# Altium footprint library Sajad_Altium_Library.PcbLib: 333 footprints (part 1 of 21)
Each footprint in its own frame and in the unit in brackets; x right, y up, seen from the top. Pads: shape width x height; smd on the part's side, far side on the other; paste and mask are expansions set on the pad; w line width, h text height; cw(c..) or ccw(c..) is an arc to the next point about the centre after c.
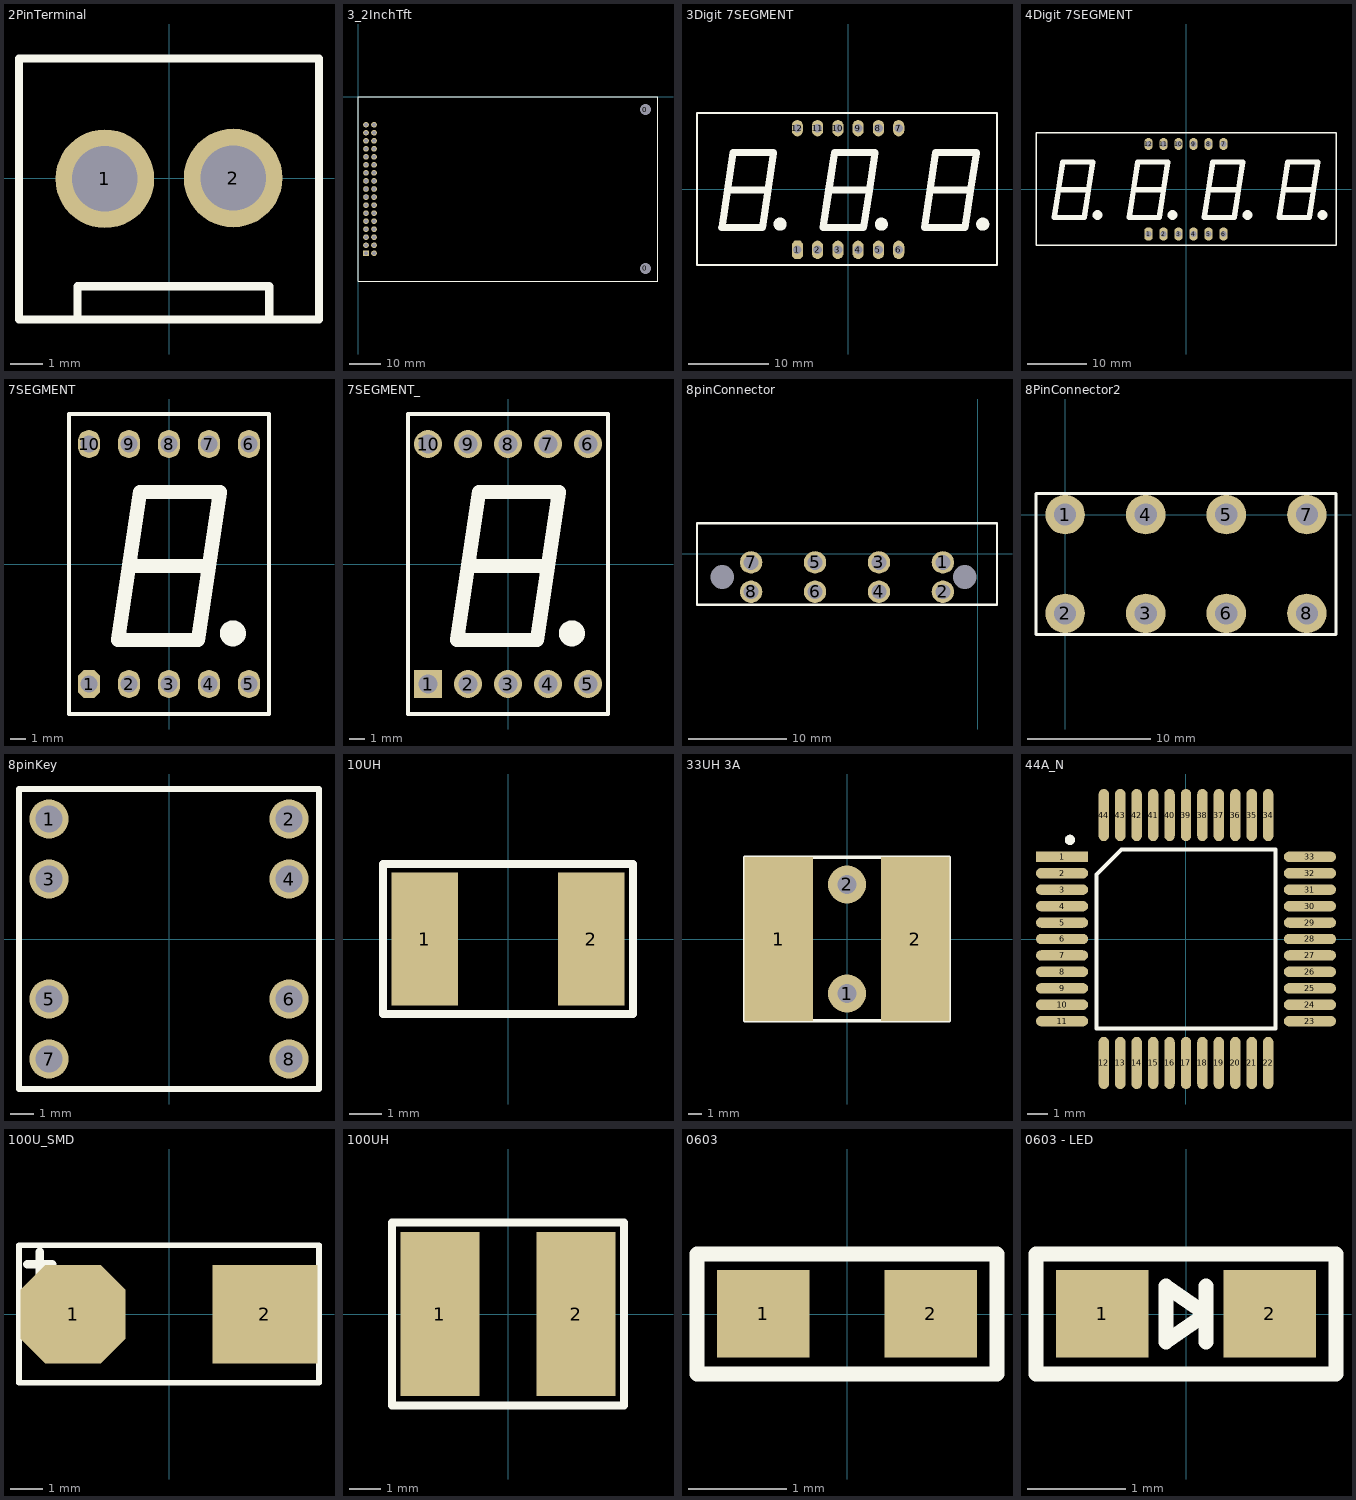
[diagram p0: the footprints below, top view; thin cyan lines are the x and y axes]

## 2PinTerminal [mm]
pads (2):
  round 3.02 hole 2: 1(-1.962,-0.013) 2(1.962,0.013)
Top Overlay:
  lines w0.254: -2.8,-4.318 -2.8,-3.302 3.067,-3.302 3.067,-4.318 ; -4.591,-4.318 4.591,-4.318 4.591,3.67 -4.591,3.67 -4.591,-4.318

## 3_2InchTft [mil]
height 372.05
pads (36):
  round 118.11 hole 137.8: 0(3577.13,-2133.86) 0(3577.13,-157.48)
  rect 70x70 hole 45: 1(99.61,-1945.67)
  round 70 hole 45: 2(199.61,-1945.67) 3(99.61,-1845.67) 4(199.61,-1845.67) 5(99.61,-1745.67) 6(199.61,-1745.67) 7(99.61,-1645.67) 8(199.61,-1645.67) 9(99.61,-1545.67) 10(199.61,-1545.67) 11(99.61,-1445.67) 12(199.61,-1445.67) 13(99.61,-1345.67) 14(199.61,-1345.67) 15(99.61,-1245.67) 16(199.61,-1245.67) 17(99.61,-1145.67) 18(199.61,-1145.67) 19(99.61,-1045.67) 20(199.61,-1045.67) 21(99.61,-945.67) 22(199.61,-945.67) 23(99.61,-845.67) 24(199.61,-845.67) 25(99.61,-745.67) 26(199.61,-745.67) 27(99.61,-645.67) 28(199.61,-645.67) 29(99.61,-545.67) 30(199.61,-545.67) 31(99.61,-445.67) 32(199.61,-445.67) 33(99.61,-345.67) 34(199.61,-345.67)
Top Overlay:
  lines w7.87: 0,-2291.34 3734.61,-2291.34 3734.61,0 0,0 0,-2291.34
3D body: height 682.99, standoff 114.69, extent 33.82,-2291.34 3734.61,228.35

## 3Digit 7SEGMENT [mm]
pads (12):
  oct 1.4x2.286 hole 1.1: 1(-6.35,-7.62)
  oval 1.4x2.286 hole 1.1: 2(-3.81,-7.62) 3(-1.27,-7.62) 4(1.27,-7.62) 5(3.81,-7.62) 6(6.35,-7.62)
  oval 1.4x2.032 hole 1.1: 7(6.35,7.62) 8(3.81,7.62) 9(1.27,7.62) 10(-1.27,7.62) 11(-3.81,7.62) 12(-6.35,7.62)
Top Overlay:
  lines w0.254: -18.923,-9.525 -18.923,9.525 18.669,9.525 18.669,-9.525 -18.923,-9.525
  lines w0.889: -8.89,-4.318 ccw(c-8.519,-4.404) -8.885,-4.299 ; 3.81,-4.318 ccw(c4.181,-4.404) 3.815,-4.299 ; 16.51,-4.318 ccw(c16.881,-4.404) 16.515,-4.299 ; -15.113,-0.127 -15.818,-4.826 -10.738,-4.826 -10.033,-0.127 ; -15.113,-0.127 -14.408,4.572 -9.328,4.572 -10.033,-0.127 ; -15.113,-0.127 -10.033,-0.127 ; -2.413,-0.127 -3.118,-4.826 1.962,-4.826 2.667,-0.127 ; -2.413,-0.127 -1.708,4.572 3.372,4.572 2.667,-0.127 ; -2.413,-0.127 2.667,-0.127 ; 10.287,-0.127 9.582,-4.826 14.662,-4.826 15.367,-0.127 ; 10.287,-0.127 10.992,4.572 16.072,4.572 15.367,-0.127 ; 10.287,-0.127 15.367,-0.127
3D body: height 8.1, standoff -4, extent -18.8,-9.5 18.8,9.5

## 4Digit 7SEGMENT [mm]
pads (12):
  oct 1.4x2.286 hole 1.1: 1(-6.35,-7.62)
  oval 1.4x2.286 hole 1.1: 2(-3.81,-7.62) 3(-1.27,-7.62) 4(1.27,-7.62) 5(3.81,-7.62) 6(6.35,-7.62)
  oval 1.4x2.032 hole 1.1: 7(6.35,7.62) 8(3.81,7.62) 9(1.27,7.62) 10(-1.27,7.62) 11(-3.81,7.62) 12(-6.35,7.62)
Top Overlay:
  lines w0.254: 25.4,-9.525 25.4,9.525 ; 25.4,-9.525 25.4,9.525 ; 25.4,-9.525 -25.4,-9.525 -25.4,9.525 25.4,9.525
  lines w0.889: -15.367,-4.318 ccw(c-14.996,-4.404) -15.362,-4.299 ; -2.667,-4.318 ccw(c-2.296,-4.404) -2.662,-4.299 ; 10.033,-4.318 ccw(c10.404,-4.404) 10.038,-4.299 ; -21.59,-0.127 -16.51,-0.127 ; -21.59,-0.127 -20.885,4.572 -15.805,4.572 -16.51,-0.127 ; -21.59,-0.127 -22.295,-4.826 -17.215,-4.826 -16.51,-0.127 ; -8.89,-0.127 -3.81,-0.127 ; -8.89,-0.127 -8.185,4.572 -3.105,4.572 -3.81,-0.127 ; -8.89,-0.127 -9.595,-4.826 -4.515,-4.826 -3.81,-0.127 ; 3.81,-0.127 8.89,-0.127 ; 3.81,-0.127 4.515,4.572 9.595,4.572 8.89,-0.127 ; 3.81,-0.127 3.105,-4.826 8.185,-4.826 8.89,-0.127 ; 15.805,-4.826 16.51,-0.127 ; 15.805,-4.826 20.885,-4.826 ; 15.805,-4.826 20.885,-4.826 ; 15.805,-4.826 16.51,-0.127 ; 16.51,-0.127 17.215,4.572 ; 16.51,-0.127 21.59,-0.127 ; 16.51,-0.127 21.59,-0.127 ; 16.51,-0.127 17.215,4.572 ; 17.215,4.572 22.295,4.572 ; 17.215,4.572 22.295,4.572 ; 20.885,-4.826 21.59,-0.127 ; 20.885,-4.826 21.59,-0.127 ; 21.59,-0.127 22.295,4.572 ; 21.59,-0.127 22.295,4.572 ; 22.733,-4.318 ccw(c23.104,-4.404) 22.738,-4.299 cw(c23.104,-4.404) 22.733,-4.318
3D body: height 8, standoff -4.1, extent -25.15,-9.5 25.15,9.5

## 7SEGMENT [mm]
pads (10):
  oct 1.4x1.778 hole 1.1: 1(-5.08,-7.62)
  oval 1.4x1.778 hole 1.1: 2(-2.54,-7.62) 3(0,-7.62) 4(2.54,-7.62) 5(5.08,-7.62) 6(5.08,7.62) 7(2.54,7.62) 8(0,7.62) 9(-2.54,7.62) 10(-5.08,7.62)
Top Overlay:
  lines w0.254: -6.35,-9.525 -6.35,9.525 6.35,9.525 6.35,-9.525 -6.35,-9.525
  lines w0.889: 3.683,-4.318 ccw(c4.054,-4.404) 3.688,-4.299 ; -2.54,-0.127 -3.245,-4.826 1.835,-4.826 2.54,-0.127 ; -2.54,-0.127 -1.835,4.572 3.245,4.572 2.54,-0.127 ; -2.54,-0.127 2.54,-0.127
3D body: height 7.62, standoff -3.88, extent -6.15,-9.5 6.15,9.5

## 7SEGMENT_ [mil]
pads (10):
  rect 70x70 hole 47.24: 1(-200,-300)
  round 70 hole 47.24: 2(-100,-300) 3(0,-300) 4(100,-300) 5(200,-300) 6(200,300) 7(100,300) 8(0,300) 9(-100,300) 10(-200,300)
Top Overlay:
  lines w10: -250,-375 250,-375 250,375 -250,375 -250,-375
  lines w35: 145,-170 ccw(c159.62,-173.37) 145.19,-169.25 ; -100,-5 100,-5 ; -100,-5 -72.25,180 127.75,180 100,-5 ; -100,-5 -127.75,-190 72.25,-190 100,-5
3D body: height 300, standoff -152.76, extent -242.12,-374.01 242.13,374.02

## 8pinConnector [mil] "8PinConnector for Anti pinch 206"
pads (10):
  round 90 hole 60: 1(-141,-35) 2(-141,-153) 3(-398,-35) 4(-398,-153) 5(-655,-35) 6(-655,-153) 7(-912,-35) 8(-912,-153)
  round 0 hole 95: 9(-1028,-94) 9(-53,-94)
Top Overlay:
  lines w10: -1129.5,-205 76.5,-205 76.5,122 -1129.5,122 -1129.5,-205
3D body: height 642.38, standoff -121.4, extent -1121.37,-208 83.36,858.93

## 8PinConnector2 [mm] "ATP Connector"
pads (8):
  round 3.2 hole 1.8: 1(0,0) 2(0,-8) 3(6.528,-8) 4(6.528,0) 5(13.056,0) 6(13.056,-8) 7(19.583,0) 8(19.583,-8)
Top Overlay:
  lines w0.254: -2.358,-9.7 21.942,-9.7 21.942,1.7 -2.358,1.7 -2.358,-9.7

## 8pinKey [mil] "8PinKey"
pads (8):
  round 65 hole 45: 1(-200,200) 2(200,200) 3(-200,100) 4(200,100) 5(-200,-100) 6(200,-100) 7(-200,-200) 8(200,-200)
Top Overlay:
  lines w10: -250,-250 -250,250 250,250 250,-250 -250,-250

## 10UH [mil] "Inductor Smd"
pads (2):
  rect 80x160 smd: 1(-100,0) 2(100,0)
Top Overlay:
  lines w10: -150,-90 150,-90 150,90 -150,90 -150,-90
3D body: height 125.98, standoff 0, extent -88.58,-60 88.58,65.98

## 33UH 3A [mm] "33uH 3A 10x10mm Power SMD"
pads (4):
  rect 5x12 smd: 1(-5,0) 2(5,0)
  round 2.794 hole 1.397: 1(0,-4) 2(0,4)
Top Overlay:
  lines w0.254: -7.5,-6 7.5,-6 7.5,6 -7.5,6 -7.5,-6
3D body: height 10, standoff 0, extent -6,-6 6,6

## 44A_N [mil] "Thin QFP, 44-Leads, Body 10x10mm, Pitch 0.8mm, IPC Medium Density"
height 47.24
pads (44):
  rect 100x20 smd: 1(-237.44,157.48)
  oval 100x20 smd: 2(-237.44,125.98) 3(-237.44,94.49) 4(-237.44,62.99) 5(-237.44,31.5) 6(-237.44,0) 7(-237.44,-31.5) 8(-237.44,-62.99) 9(-237.44,-94.49) 10(-237.44,-125.98) 11(-237.44,-157.48) 23(237.44,-157.48) 24(237.44,-125.98) 25(237.44,-94.49) 26(237.44,-62.99) 27(237.44,-31.5) 28(237.44,0) 29(237.44,31.5) 30(237.44,62.99) 31(237.44,94.49) 32(237.44,125.98) 33(237.44,157.48)
  oval 20x100 smd: 12(-157.48,-237.44) 13(-125.98,-237.44) 14(-94.49,-237.44) 15(-62.99,-237.44) 16(-31.5,-237.44) 17(0,-237.44) 18(31.5,-237.44) 19(62.99,-237.44) 20(94.49,-237.44) 21(125.98,-237.44) 22(157.48,-237.44) 34(157.48,237.44) 35(125.98,237.44) 36(94.49,237.44) 37(62.99,237.44) 38(31.5,237.44) 39(0,237.44) 40(-31.5,237.44) 41(-62.99,237.44) 42(-94.49,237.44) 43(-125.98,237.44) 44(-157.48,237.44)
Top Overlay:
  circle w9.84: c-222.44,189.96 r4.92
  lines w7.87: -171.26,-171.26 -171.26,123.74 -123.74,171.26 171.26,171.26 171.26,-171.26 -171.26,-171.26

## 100U_SMD [mm]
pads (2):
  oct 3.2x3 smd: 1(-2.921,0)
  rect 3.2x3 smd: 2(2.921,0)
Top Overlay:
  lines w0.178: -4.572,-2.083 -4.572,2.108 4.572,2.108 4.572,-2.083 -4.572,-2.083
  lines w0.254: -4.321,1.524 -3.556,1.524 ; -3.937,1.143 -3.937,1.908
3D body: height 2.67, standoff -0.02, extent -3.016,-1.626 3.169,1.58

## 100UH [mm] "SCD503T-101K-N SMD Power Inductors"
pads (2):
  rect 2.5x5.2 smd: 1(-2.159,0) 2(2.159,0)
Top Overlay:
  lines w0.254: -3.683,-2.9 -3.683,2.9 3.683,2.9 3.683,-2.9 -3.683,-2.9
3D body: height 5.3, standoff 0, extent -3.9,-3.9 3.9,3.9

## 0603 [mil]
pads (2):
  rect 37x35 smd: 1(-33.5,0) 2(33.5,0)
Top Overlay:
  lines w6: -60,-24 -60,24 0,24 60,24 60,-24 0,-24 -60,-24
3D body: height 11.89, standoff 0, extent -31.49,-15.74 31.5,15.75

## 0603 - LED [mil]
pads (2):
  rect 37x35 smd: 1(-33.5,0) 2(33.5,0)
Top Overlay:
  lines w4: 8,-11.12 8,11.12 ; -8.06,-11.12 -8.06,11.12 8,0 -8.06,-11.12
  lines w6: 8,-11.12 8,11.12 ; -60,-24 -60,24 0,24 60,24 60,-24 0,-24 -60,-24 ; -8.06,-11.12 -8.06,11.12 8,0 -8.06,-11.12
3D body: height 43.31, standoff 0, extent -31.88,-15.74 31.9,15.75